# Altium footprint library RT1064_MotherBoard V3.PcbLib: 45 footprints (part 2 of 3)
Each footprint in its own frame and in the unit in brackets; x right, y up, seen from the top. Pads: shape width x height; smd on the part's side, far side on the other; paste and mask are expansions set on the pad; w line width, h text height; cw(c..) or ccw(c..) is an arc to the next point about the centre after c.
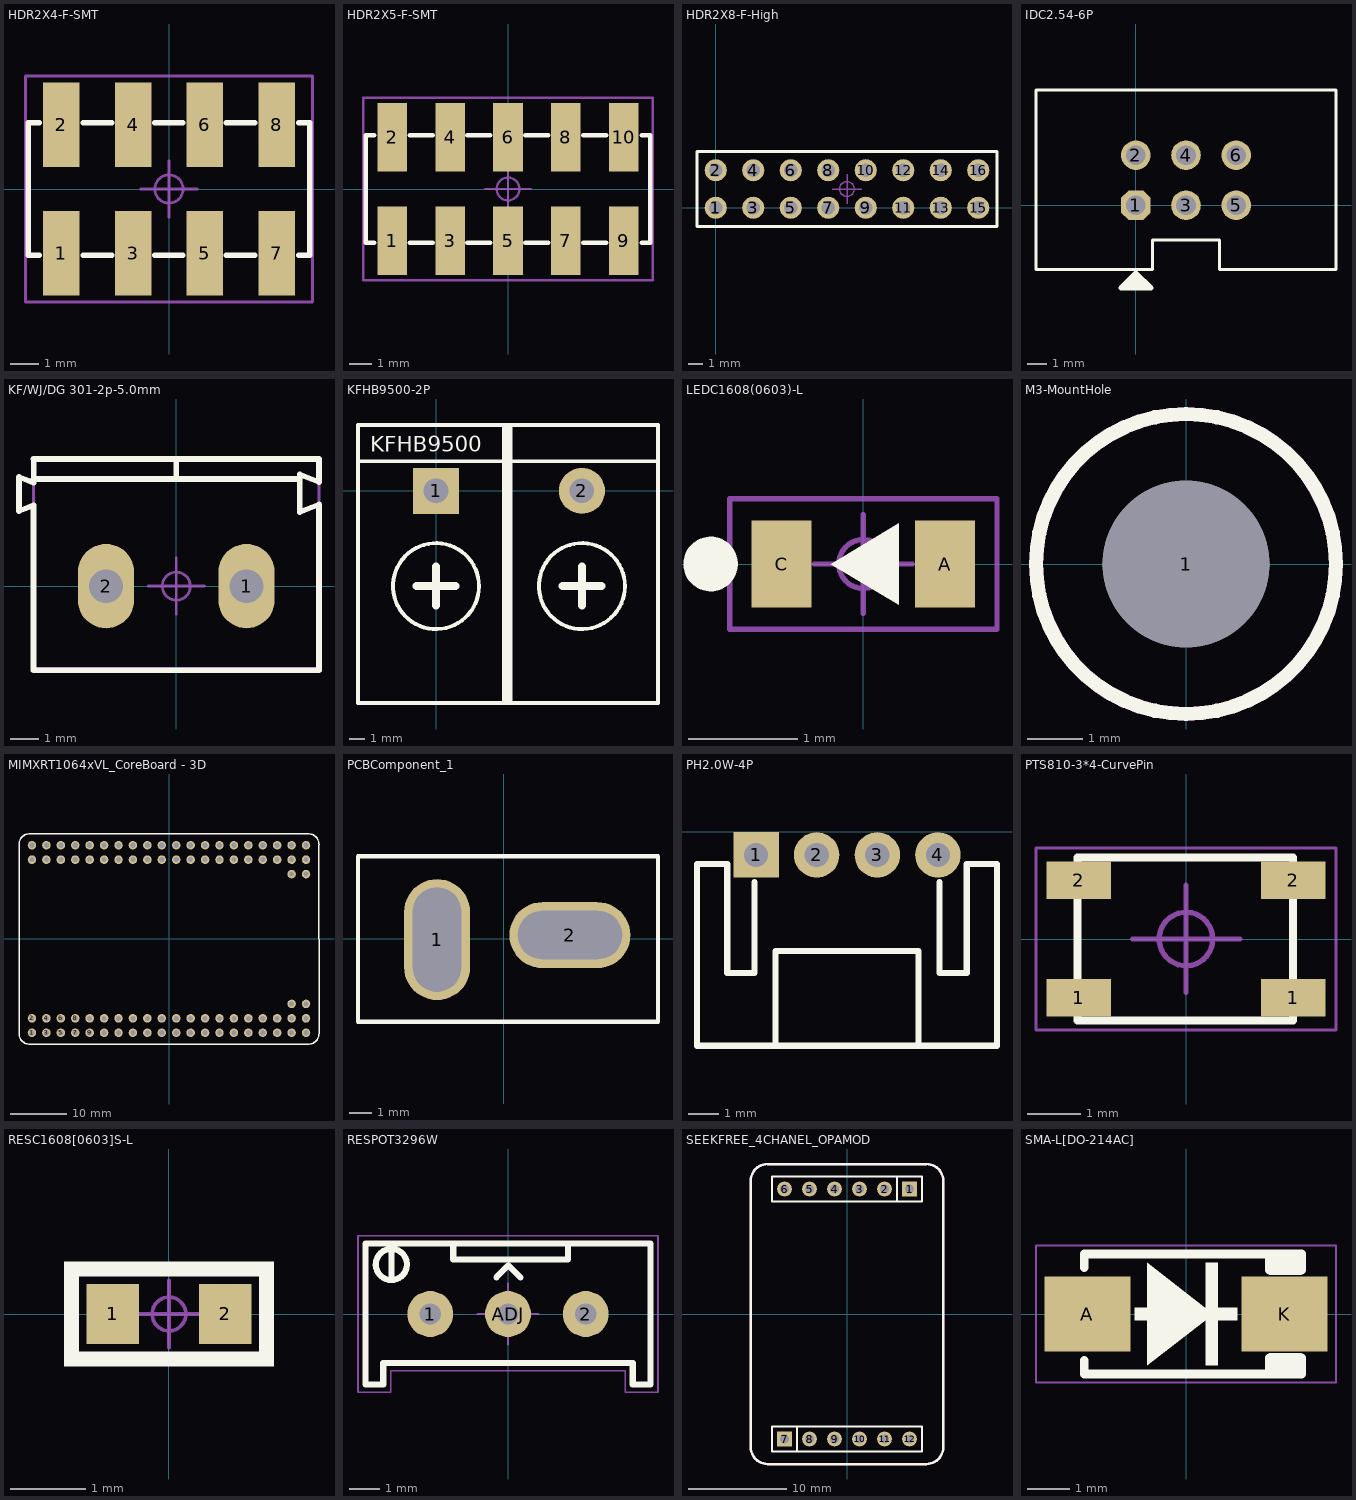
[diagram p1: the footprints below, top view; thin cyan lines are the x and y axes]

## HDR2X4-F-SMT [mm]
pads (8):
  rect 1.3x3 smd: 1(-3.81,-2.27) 2(-3.81,2.27) 3(-1.27,-2.27) 4(-1.27,2.27) 5(1.27,-2.27) 6(1.27,2.27) 7(3.81,-2.27) 8(3.81,2.27)
Top Overlay:
  lines w0.2: -4.597,-2.35 -4.978,-2.35 -4.978,2.35 -4.597,2.35 ; -3.03,-2.35 -2.03,-2.35 ; -3.03,2.35 -2.03,2.35 ; -0.51,-2.35 0.49,-2.35 ; -0.51,2.35 0.49,2.35 ; 2.03,-2.35 3.03,-2.35 ; 2.03,2.35 3.03,2.35 ; 4.597,-2.35 4.978,-2.35 4.978,2.35 4.597,2.35
Top Designator:
  text ".Designator" at -1.961,-0.321 h1
Top Component Outline:
  lines w0.1: -5.08,-4 -5.08,4 5.08,4 5.08,-4 3.825,-4 -5.08,-4
Top Component Center:
  circle w0.1: c0,0 r0.5
  lines w0.1: -1,0 1,0 ; 0,-1 0,1
3D body "61000821821-无盖.STEP": height 7.47, standoff -0.03, extent -5.08,-3.35 5.08,3.35

## HDR2X5-F-SMT [mm]
pads (10):
  rect 1.3x3 smd: 1(-5.08,-2.27) 2(-5.08,2.27) 3(-2.54,-2.27) 4(-2.54,2.27) 5(0,-2.27) 6(0,2.27) 7(2.54,-2.27) 8(2.54,2.27) 9(5.08,-2.27) 10(5.08,2.27)
Top Overlay:
  lines w0.2: -5.867,-2.35 -6.248,-2.35 -6.248,2.35 -5.867,2.35 ; -4.3,-2.35 -3.3,-2.35 ; -4.3,2.35 -3.3,2.35 ; -1.78,-2.35 -0.78,-2.35 ; -1.78,2.35 -0.78,2.35 ; 0.76,-2.35 1.76,-2.35 ; 0.76,2.35 1.76,2.35 ; 3.3,-2.35 4.3,-2.35 ; 3.3,2.35 4.3,2.35 ; 5.867,-2.35 6.248,-2.35 6.248,2.35 5.867,2.35
Top Designator:
  text ".Designator" at -1.961,-0.196 h1
Top Component Outline:
  lines w0.1: -6.35,-4 6.35,-4 6.35,4 -6.35,4 -6.35,-4
Top Component Center:
  circle w0.1: c0,0 r0.5
  lines w0.1: -1,0 1,0 ; 0,-1 0,1
3D body "61001021821.STEP": height 7.47, standoff -0.03, extent -6.35,-3.42 6.35,3.28

## HDR2X8-F-High [mm]
pads (16):
  round 1.5 hole 0.9: 1(0,0) 2(0,2.54) 3(2.54,0) 4(2.54,2.54) 5(5.08,0) 6(5.08,2.54) 7(7.62,0) 8(7.62,2.54) 9(10.16,0) 10(10.16,2.54) 11(12.7,0) 12(12.7,2.54) 13(15.24,0) 14(15.24,2.54) 15(17.78,0) 16(17.78,2.54)
Top Overlay:
  lines w0.2: -1.27,-1.27 -1.27,3.81 19.05,3.81 19.05,-1.27 -1.27,-1.27
Top Designator:
  text ".Designator" at 6.637,1.044 h1
Top Component Outline:
  lines w0.1: -1.27,-1.27 19.05,-1.27 19.05,3.81 -1.27,3.81 -1.27,-1.27
Top Component Center:
  circle w0.1: c8.89,1.27 r0.5
  lines w0.1: 7.89,1.27 9.89,1.27 ; 8.89,0.27 8.89,2.27
3D body "2x8加高直插排座.step": height 16.2, standoff -3.3, extent -1.52,-1.27 19.3,3.81

## IDC2.54-6P [mm]
pads (6):
  oct 1.5x1.5 hole 1: 1(0,0)
  round 1.5 hole 1: 2(0,2.54) 3(2.54,0) 4(2.54,2.54) 5(5.08,0) 6(5.08,2.54)
Top Overlay:
  lines w0.15: 10.14,-3.26 4.24,-3.26 4.24,-1.76 0.84,-1.76 0.84,-3.26 -5.06,-3.26 -5.06,5.84 10.14,5.84 10.14,-3.23
  lines w0.254: -0.508,-4.191 -0.254,-3.937 ; -0.381,-3.81 0.127,-3.81 0.508,-4.191 ; 0,-3.683 0,-3.429 ; -0.254,-3.937 0,-4.191 0.508,-4.191 ; -0.254,-3.937 0.254,-3.937 0.508,-4.191 ; 0,-3.429 -0.762,-4.191 0.508,-4.191 ; 0,-3.429 0.762,-4.191 0.508,-4.191
Bottom Overlay:
  lines w0.6: -1.041,1.27 6.325,1.27 ; 1.27,-1.016 1.27,3.353 ; 3.81,-1.016 3.81,3.353
3D body "IDC-6.STEP": height 8.92, standoff -3.48, extent -5.07,-2.947 10.15,5.903

## KF/WJ/DG 301-2p-5.0mm [mm]
pads (2):
  oval 2x3 hole 1.2: 1(2.5,0) 2(-2.5,0)
Top Overlay:
  lines w0.2: -5.08,2.879 -5.6,2.676 -5.6,3.886 -5.08,3.683 -5.08,4.525 ; 5.08,-2.997 5.08,2.904 4.394,2.636 4.394,3.976 5.08,3.708 5.08,4.525
  lines w0.203: -5.08,2.879 -5.08,-2.997 5.08,-2.997 ; -5.08,3.81 4.365,3.81 ; -5.08,4.525 5.08,4.525 ; 0,3.81 0,4.445
Top Designator:
  text ".Designator" at -2.221,0.568 h1
Top Component Outline:
  lines w0.1: -5.08,-2.921 -5.08,4.572 5.08,4.572 5.08,-2.921 -5.08,-2.921
Top Component Center:
  circle w0.1: c0,0 r0.5
  lines w0.1: -1,0 1,0 ; 0,-1 0,1
3D body "Terminal-Screw-3A-2way.step": height 10, standoff -3, extent -5.6,-3 5,4.6

## KFHB9500-2P [mm]
pads (2):
  rect 3x3 hole 1.6: 1(0,0)
  round 3 hole 1.6: 2(9.5,0)
Top Overlay:
  circle w0.254: c0,-6.2 r2.8
  circle w0.254: c9.5,-6.2 r2.8
  lines w0.254: -5.08,1.928 4.826,1.928 ; 4.42,1.928 14.326,1.928 ; 4.674,-13.82 4.674,4.3 ; -5.08,-13.82 -5.08,4.3 4.853,4.3 4.853,-13.82 -5.08,-13.82 ; 4.42,-13.82 4.42,4.3 14.453,4.3 14.453,-13.82 4.42,-13.82
  lines w0.508: -1.27,-6.2 1.27,-6.2 ; 0,-7.47 0,-4.93 ; 8.23,-6.2 10.77,-6.2 ; 9.5,-7.47 9.5,-4.93
  text "KFHB9500" at -4.267,2.563 h1.02
3D body "KFHB9500.STEP": height 14.05, standoff -3.25, extent 4.293,-13.699 14.293,4.301
3D body "KFHB9500.STEP": height 14.05, standoff -3.25, extent -5.207,-13.699 4.793,4.301

## LEDC1608(0603)-L [mm]
pads (2):
  rect 0.55x0.8 smd: A(0.75,0) C(-0.75,0)
Top Overlay:
  circle w0.25: c-1.4,0 r0.125
  region: -0.3,0 0.325,0.375 0.325,-0.375
Top Designator:
  text ".Designator" at -1.961,-0.196 h1
Top Component Outline:
  lines w0.05: -1.225,-0.6 -1.225,0.6 1.225,0.6 1.225,-0.6 -1.225,-0.6
Top Component Center:
  circle w0.05: c0,0 r0.225
  lines w0.05: -0.45,0 0.45,0 ; 0,-0.45 0,0.45
3D body: height 0.64, standoff 0, extent -0.559,-0.4 0.559,0.4
3D body "0603 (1608) LED Base (Separate Lens).STEP": height 0.64, standoff 0, extent -0.8,-0.4 0.8,0.4

## M3-MountHole [mm]
pads (1):
  round 3 hole 3 unplated mask+0: 1(0,0)
Top Overlay:
  circle w0.254: c0,0 r2.7
  lines w0.2: -0.4,-0.4 0.4,0.4 ; -0.4,0.4 0.4,-0.4
Bottom Overlay:
  circle w0.254: c0,0 r2.7
Keep-Out Layer:
  circle w0.254: c0,0 r2.7

## MIMXRT1064xVL_CoreBoard - 3D [mm]
pads (84):
  round 1.5 hole 0.9: 1(-24.13,-16.51) 2(-24.13,-13.97) 3(-21.59,-16.51) 4(-21.59,-13.97) 5(-19.05,-16.51) 6(-19.05,-13.97) 7(-16.51,-16.51) 8(-16.51,-13.97) 9(-13.97,-16.51) 10(-13.97,-13.97) 11(-11.43,-16.51) 12(-11.43,-13.97) 13(-8.89,-16.51) 14(-8.89,-13.97) 15(-6.35,-16.51) 16(-6.35,-13.97) 17(-3.81,-16.51) 18(-3.81,-13.97) 19(-1.27,-16.51) 20(-1.27,-13.97) 21(1.27,-16.51) 22(1.27,-13.97) 23(3.81,-16.51) 24(3.81,-13.97) 25(6.35,-16.51) 26(6.35,-13.97) 27(8.89,-16.51) 28(8.89,-13.97) 29(11.43,-16.51) 30(11.43,-13.97) 31(13.97,-16.51) 32(13.97,-13.97) 33(16.51,-16.51) 34(16.51,-13.97) 35(19.05,-16.51) 36(19.05,-13.97) 37(21.59,-16.51) 38(21.59,-13.97) 39(24.13,-16.51) 40(24.13,-13.97) 41(21.59,-11.43) 42(24.13,-11.43) 43(24.13,11.43) 44(21.59,11.43) 45(24.13,13.97) 46(24.13,16.51) 47(21.59,13.97) 48(21.59,16.51) 49(19.05,13.97) 50(19.05,16.51) 51(16.51,13.97) 52(16.51,16.51) 53(13.97,13.97) 54(13.97,16.51) 55(11.43,13.97) 56(11.43,16.51) 57(8.89,13.97) 58(8.89,16.51) 59(6.35,13.97) 60(6.35,16.51) 61(3.81,13.97) 62(3.81,16.51) 63(1.27,13.97) 64(1.27,16.51) 65(-1.27,13.97) 66(-1.27,16.51) 67(-3.81,13.97) 68(-3.81,16.51) 69(-6.35,13.97) 70(-6.35,16.51) 71(-8.89,13.97) 72(-8.89,16.51) 73(-11.43,13.97) 74(-11.43,16.51) 75(-13.97,13.97) 76(-13.97,16.51) 77(-16.51,13.97) 78(-16.51,16.51) 79(-19.05,13.97) 80(-19.05,16.51) 81(-21.59,13.97) 82(-21.59,16.51) 83(-24.13,13.97) 84(-24.13,16.51)
Top Overlay:
  lines w0.254: -26.416,-16.637 ccw(c-24.511,-16.637) -24.511,-18.542 24.511,-18.542 ccw(c24.511,-16.637) 26.416,-16.637 26.416,16.637 ccw(c24.511,16.637) 24.511,18.542 -24.511,18.542 ccw(c-24.511,16.637) -26.416,16.637 -26.416,-16.637
Top Designator:
  text ".Designator" at 9.817,0.981 h5
3D body "1x2.stp": height 8.25, standoff -3.36, extent 19.96,-12.68 25.54,-10.18
3D body "1x2.stp": height 8.25, standoff -3.36, extent 19.96,10.18 25.54,12.68
3D body "2x18.stp": height 8.2, standoff -3.35, extent -25.65,-17.77 25.65,-12.69
3D body "2x18.stp": height 8.2, standoff -3.35, extent -25.65,12.71 25.65,17.79
3D body "IMXRT1064-xVL V14.step": height 21.04, standoff 2.29, extent -26.416,-18.542 26.416,18.542

## PCBComponent_1 [mil]
pads (2):
  oval 118x216 hole 86 slot 186 at 90 deg: 1(-119,-1)
  oval 216x118 hole 86 slot 186 at 0 deg: 2(118,7)
Top Overlay:
  lines w8: -260,-148 -260,148 275,148 275,-148 -260,-148

## PH2.0W-4P [mm]
pads (4):
  rect 1.5x1.5 hole 0.8: 1(4.239,-0.762)
  round 1.5 hole 0.8: 2(6.239,-0.762) 3(8.239,-0.762) 4(10.239,-0.762)
Top Overlay:
  lines w0.203: 4.189,-1.662 4.189,-4.662 3.289,-4.662 3.289,-4.062 3.289,-1.062 3.239,-1.062 2.289,-1.062 2.289,-7.062 12.189,-7.062 12.189,-1.062 11.239,-1.062 11.189,-1.062 11.189,-4.062 11.189,-4.662 10.289,-4.662 10.289,-1.662 ; 4.874,-6.977 4.874,-3.937 9.604,-3.937 9.604,-6.977

## PTS810-3*4-CurvePin [mm]
pads (4):
  rect 1.2x0.7 smd: 1(-2,-1.1) 1(2,-1.1) 2(-2,1.1) 2(2,1.1)
Top Overlay:
  lines w0.152: -2.025,-1.524 2,-1.524 2,1.524 -2.025,1.524 -2.025,-1.524
Top Designator:
  text ".Designator" at 1.961,0.196 h1
Top Component Outline:
  lines w0.05: -2.8,-1.7 -2.8,1.7 2.8,1.7 2.8,-1.7 -2.8,-1.7
Top Component Center:
  circle w0.1: c0,0 r0.5
  lines w0.1: -1,0 1,0 ; 0,-1 0,1
3D body "User Library-PTS810.STEP": height 2.5, standoff 0, extent -2.301,-1.6 2.299,1.6

## RESC1608[0603]S-L [mm]
pads (2):
  rect 0.7x0.8 smd: 1(-0.75,0) 2(0.75,0)
Top Overlay:
  rectangle: -1.4,0.5 1.4,0.7
  region: -1.4,0.7 -1.4,-0.7 -1.2,-0.7 -1.2,0.7
  rectangle: -1.4,-0.7 1.4,-0.5
  region: 1.4,-0.7 1.4,0.7 1.2,0.7 1.2,-0.7
Top Designator:
  text ".Designator" at -2.253,-0.226 h1
Top Component Outline:
  rectangle: -1.35,-0.65 -1.3,0.65
  region: 1.35,0.6 1.35,0.65 -1.35,0.65 -1.35,0.6
  region: 1.35,0.65 1.3,0.65 1.3,-0.65 1.35,-0.65
  region: -1.35,-0.6 -1.35,-0.65 1.35,-0.65 1.35,-0.6
Top Component Center:
  circle w0.05: c0,0 r0.225
  lines w0.05: -0.45,0 0.45,0 ; 0,-0.45 0,0.45
3D body "R0603.STEP": height 0.45, standoff 0, extent -0.8,-0.4 0.8,0.4

## RESPOT3296W [mm]
pads (3):
  round 1.5 hole 0.7: 1(-2.54,0) 2(2.54,0) ADJ(0,0)
Top Overlay:
  lines w0.2: -3.8,1.125 -3.8,2.125 ; -3.302,1.651 ccw(c-3.81,1.618) -3.301,1.608 ; -1.79,2.286 -1.79,1.778 1.96,1.778 1.96,2.286 ; -0.381,1.194 0.013,1.587 0.406,1.194 ; -4.65,-2.3 -4.65,2.3 4.65,2.3 4.65,-2.3 4.075,-2.3 4.075,-1.602 -4.075,-1.602 -4.075,-2.3 -4.65,-2.3
Top Designator:
  text ".Designator" at -2.051,-0.296 h1
Top Component Outline:
  lines w0.05: -4.9,-2.55 -4.9,2.55 4.9,2.55 4.9,-2.55 3.825,-2.55 3.825,-1.85 2.8,-1.85 -3.16,-1.85 -3.825,-1.85 -3.825,-2.55 -4.9,-2.55
Top Component Center:
  circle w0.05: c0,0 r0.5
  lines w0.05: -1,0 1,0 ; 0,-1 0,1
3D body "3296.STEP": height 3.1, standoff -11.9, extent -4.75,-2.4 4.75,2.4

## SEEKFREE_4CHANEL_OPAMOD [mm]
pads (12):
  rect 1.5x1.5 hole 0.9: 1(6.35,12.7) 7(-6.35,-12.7)
  round 1.5 hole 0.9: 2(3.81,12.7) 3(1.27,12.7) 4(-1.27,12.7) 5(-3.81,12.7) 6(-6.35,12.7) 8(-3.81,-12.7) 9(-1.27,-12.7) 10(1.27,-12.7) 11(3.81,-12.7) 12(6.35,-12.7)
Top Overlay:
  lines w0.2: -5.1,-13.95 -5.1,-11.45 ; 5.1,11.45 5.1,13.95 ; -7.62,-13.97 7.62,-13.97 7.62,-11.43 -7.62,-11.43 -7.62,-13.97 ; -7.62,11.43 7.62,11.43 7.62,13.97 -7.62,13.97 -7.62,11.43
Top Overlay keep-out:
  lines w0.254: -9.779,-13.524 ccw(c-8.063,-13.524) -8.063,-15.24 8.063,-15.24 ccw(c8.063,-13.524) 9.779,-13.524 9.779,13.524 ccw(c8.063,13.524) 8.063,15.24 -8.063,15.24 ccw(c-8.063,13.524) -9.779,13.524 -9.779,-13.524
Top Designator:
  text ".Designator" at -1.961,10.417 h1
3D body "1001-6.STEP": height 8.54, standoff -3, extent -7.62,11.43 7.62,13.97
3D body "1001-6.STEP": height 8.54, standoff -3, extent -7.62,-13.97 7.62,-11.43
3D body "Female-Header-2.54-Single-6.stp": height 8.5, standoff -3.2, extent -7.747,-13.975 7.743,-11.475
3D body "Female-Header-2.54-Single-6.stp": height 8.5, standoff -3.2, extent -7.743,11.475 7.747,13.975

## SMA-L[DO-214AC] [mm]
pads (2):
  rect 2x1.75 smd: A(-2.3,0) K(2.3,0)
Top Overlay:
  rectangle: -1.201,-0.148 1.199,0.152
  rectangle: 0.451,-1.2 0.751,1.2
  rectangle: 1.941,0.914 2.7,1.395
  rectangle: 1.941,-1.4 2.7,-0.914
  region: -0.902,1.2 -0.902,-1.2 0.635,0
  lines w0.2: -2.375,-1.075 -2.375,-1.4 2.7,-1.4 2.7,-1.016 ; -2.375,1.075 -2.375,1.4 2.7,1.4 2.7,1.016 ; 1.941,-1.395 1.941,-1.016 ; 1.941,1.016 1.941,1.395
Top Designator:
  text ".Designator" at -1.961,-0.196 h1
Top Component Outline:
  lines w0.05: -3.5,-1.6 -3.5,1.6 3.5,1.6 3.5,-1.6 -3.5,-1.6
Top Component Center:
  circle w0.05: c0,0 r0.225
  lines w0.05: -0.45,0 0.45,0 ; 0,-0.45 0,0.45
3D body "SMA(DO-214AC).STEP": height 2.3, standoff 0, extent -2.905,-1.46 2.905,1.46